# Altium footprint library CUSTOM PCB.PcbLib: 404 footprints (part 25 of 26)
Each footprint in its own frame and in the unit in brackets; x right, y up, seen from the top. Pads: shape width x height; smd on the part's side, far side on the other; paste and mask are expansions set on the pad; w line width, h text height; cw(c..) or ccw(c..) is an arc to the next point about the centre after c.
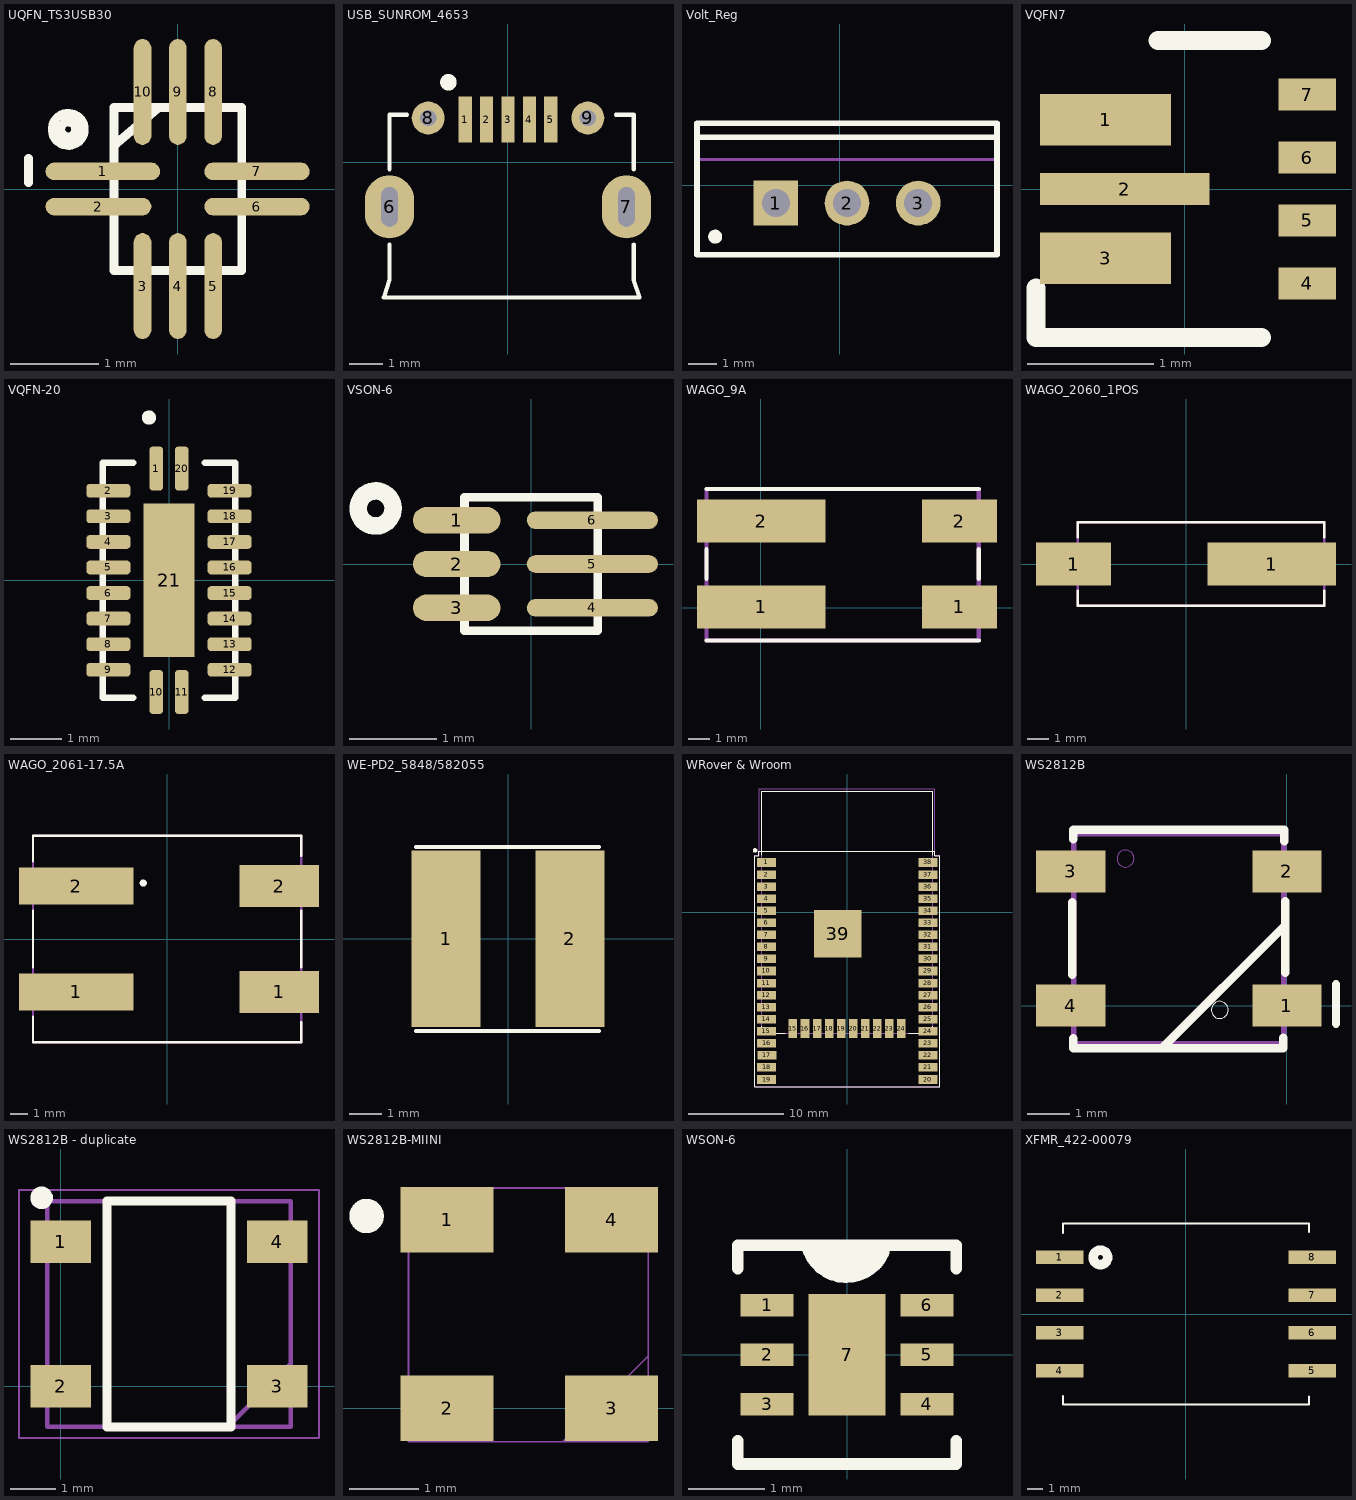
[diagram p24: the footprints below, top view; thin cyan lines are the x and y axes]

## UQFN_TS3USB30 [mm]
pads (10):
  oval 1.299x0.2 smd: 1(-0.851,0.2)
  oval 1.2x0.2 smd: 2(-0.9,-0.2)
  oval 0.2x1.2 smd: 3(-0.4,-1.1) 4(0,-1.1) 5(0.4,-1.1) 8(0.4,1.1) 9(0,1.1) 10(-0.4,1.1)
  oval 1.194x0.2 smd: 6(0.897,-0.2) 7(0.897,0.2)
Top Overlay:
  circle w0.1: c-1.242,0.676 r0.182
  circle w0.1: c-1.242,0.676 r0.085
  lines w0.1: -1.694,0.074 -1.694,0.348 ; -0.721,0.493 -0.236,0.907 ; -0.725,-0.925 0,-0.925 0.725,-0.925 0.725,0.925 -0.725,0.925 -0.725,-0.925
3D body "User Library-qfn10_rm0_4-1.step": height 0.55, standoff -0.01, extent -0.726,-0.925 0.724,0.925

## USB_SUNROM_4653 [mm]
pads (9):
  rect 0.4x1.4 smd: 1(-1.3,1.3) 2(-0.65,1.3) 3(0,1.3) 4(0.65,1.3) 5(1.3,1.3)
  oval 1.5x1.916 hole 0.5 slot 1.2 at 90 deg: 6(-3.6,-1.35) 7(3.6,-1.35)
  round 1 hole 0.5: 8(-2.425,1.35) 9(2.425,1.35)
Top Overlay:
  circle w0.4: c-1.81,2.435 r0.05
  lines w0.127: -3.597,-2.493 -3.597,-3.56 -3.775,-4.1 3.997,-4.1 3.819,-3.56 3.819,-2.493 ; -3.597,-0.207 -3.597,1.45 -3.064,1.45 ; 3.286,1.45 3.819,1.45 3.819,-0.207
Mechanical 1:
  lines w0: -3.689,-1.75 ccw(c-3.464,-1.75) -3.464,-1.975 ccw(c-3.464,-1.75) -3.239,-1.75 -3.239,-0.95 ccw(c-3.464,-0.95) -3.464,-0.725 ccw(c-3.464,-0.95) -3.689,-0.95 -3.689,-1.75 ; 3.461,-1.75 ccw(c3.686,-1.75) 3.686,-1.975 ccw(c3.686,-1.75) 3.911,-1.75 3.911,-0.95 ccw(c3.686,-0.95) 3.686,-0.725 ccw(c3.686,-0.95) 3.461,-0.95 3.461,-1.75
3D body "1050170001.stp": height 2.68, standoff -0.63, extent -4.1,-3.9 4.1,1.5

## Volt_Reg [mm] "7805 thorugh hole"
pads (3):
  rect 1.6x1.6 hole 1: 1(-2.286,-0.635)
  round 1.6 hole 1: 2(0.254,-0.635) 3(2.794,-0.635)
Top Overlay:
  circle w0.25: c-4.446,-1.835 r0.125
  lines w0.2: -5.096,1.715 5.604,1.715 ; -5.096,-2.485 -5.096,2.215 5.604,2.215 5.604,-2.485 -5.096,-2.485
Mechanical 13:
  lines w0.1: -5.096,0.915 5.604,0.915 ; -5.096,-2.485 5.604,-2.485 5.604,2.215 -5.096,2.215 -5.096,-2.485
Mechanical 15:
  lines w0.1: -0.246,-0.635 0.754,-0.635 ; 0.254,-1.135 0.254,-0.135
3D body: height 12.9, standoff 4, extent -5.146,-2.535 5.654,2.265
3D body: height 19.3, standoff 12.9, extent -5.095,0.916 5.603,2.214

## VQFN7 [mil]
pads (7):
  rect 41x16 smd paste+0 mask+0: 1(-24.68,21.65) 3(-24.68,-21.65)
  rect 53x10 smd paste+0 mask+0: 2(-18.7,0)
  rect 18x10 smd paste-5 mask+0: 4(38.39,-29.53) 5(38.39,-9.84) 6(38.39,9.84) 7(38.39,29.53)
Top Overlay:
  lines w6: -46.5,-30.94 -46.5,-46.5 24.07,-46.5 ; -8.34,46.5 24.07,46.5

## VQFN-20 [mm]
pads (21):
  rrect50% 0.27x0.86 smd: 1(-0.25,2.185) 10(-0.25,-2.185) 11(0.25,-2.185) 20(0.25,2.185)
  rrect50% 0.86x0.27 smd: 2(-1.185,1.75) 3(-1.185,1.25) 4(-1.185,0.75) 5(-1.185,0.25) 6(-1.185,-0.25) 7(-1.185,-0.75) 8(-1.185,-1.25) 9(-1.185,-1.75) 12(1.185,-1.75) 13(1.185,-1.25) 14(1.185,-0.75) 15(1.185,-0.25) 16(1.185,0.25) 17(1.185,0.75) 18(1.185,1.25) 19(1.185,1.75)
  rect 1x3 smd: 21(0,0)
Top Overlay:
  circle w0.14: c-0.392,3.181 r0.07
  lines w0.127: -0.7,-2.3 -1.3,-2.3 -1.3,2.3 -0.7,2.3 ; 0.7,-2.3 1.3,-2.3 1.3,2.3 0.7,2.3
3D body "RKS0020A.stp": height 1, standoff 0, extent -1.25,-2.25 1.25,2.25

## VSON-6 [mm]
pads (6):
  oval 1x0.3 smd paste+0 mask+0: 1(-0.85,0.5) 2(-0.85,0) 3(-0.85,-0.5)
  oval 1.5x0.2 smd paste+0 mask+0: 4(0.7,-0.5) 5(0.7,0) 6(0.7,0.5)
Top Overlay:
  circle w0.2: c-1.778,0.635 r0.2
  lines w0.1: -0.762,-0.762 0.762,-0.762 0.762,0.762 -0.762,0.762 -0.762,-0.762
3D body: height 1, standoff 0, extent -0.775,-0.775 0.775,0.775
3D body: height 0.25, standoff 0, extent 1.85,-0.6 1.85,-0.6

## WAGO_9A [mm] "AC 230V mains connector"
pads (4):
  rect 6x2 smd: 1(0.018,0.032) 2(0.018,4.032)
  rect 3.5x2 smd: 1(9.268,0.032) 2(9.268,4.032)
Top Overlay:
  lines w0.2: -2.54,-1.535 10.16,-1.535 ; -2.54,1.348 -2.54,2.716 ; -2.54,5.535 10.16,5.535 ; 10.16,1.348 10.16,2.716
Mechanical 15:
  lines w0.2: -2.54,-1.535 -2.54,5.535 10.16,5.535 10.16,-1.535 -2.54,-1.535
3D body "2060-452_998-404.stp": height 5.48, standoff -0.02, extent -2.359,-1.905 10.741,5.995

## WAGO_2060_1POS [mm]
pads (2):
  rect 3.5x2 smd: 1(-5.25,0)
  rect 6x2 smd: 1(4,0)
Top Overlay:
  lines w0.127: -5.05,-1.25 -5.05,-1.95 6.45,-1.95 6.45,-1.25 ; -5.05,1.25 -5.05,1.95 6.45,1.95 6.45,1.25
Mechanical 4:
  lines w0.127: -5.05,-1.95 -5.05,1.95 ; -5.05,-1.95 6.45,-1.95 ; -5.05,-1.95 -5.05,1.95 ; -5.05,-1.95 6.45,-1.95 ; -5.05,1.95 6.45,1.95 ; -5.05,1.95 6.45,1.95 ; 6.45,-1.95 6.45,1.95 ; 6.45,-1.95 6.45,1.95
3D body "2060-451_998-404.stp": height 5.4, standoff -0.1, extent -6.665,-1.896 6.435,2.004

## WAGO_2061-17.5A [mm]
pads (4):
  rect 6.5x2.1 smd: 1(-5.15,-3) 2(-5.15,3)
  rect 4.5x2.4 smd: 1(6.35,-3) 2(6.35,3)
Top Overlay:
  circle w0.2: c-1.358,3.169 r0.1
  lines w0.127: -7.6,-4.4 -7.6,-5.85 7.6,-5.85 7.6,-4.7 ; -7.6,-1.6 -7.6,1.6 ; -7.6,4.4 -7.6,5.85 7.6,5.85 7.6,4.7 ; 7.6,-1.6 7.6,1.6
Mechanical 4:
  lines w0.127: -7.6,-5.85 -7.6,5.85 ; -7.6,-5.85 7.6,-5.85 ; -7.6,-5.85 -7.6,5.85 ; -7.6,-5.85 7.6,-5.85 ; -7.6,5.85 7.6,5.85 ; -7.6,5.85 7.6,5.85 ; 7.6,-5.85 7.6,5.85 ; 7.6,-5.85 7.6,5.85
3D body "2061-602_998-404.stp": height 6.6, standoff -0.15, extent -7.672,-5.865 8.128,5.835

## WE-PD2_5848/582055 [mm]
pads (2):
  rect 2.15x5.5 smd: 1(-1.925,0) 2(1.925,0)
Top Overlay:
  lines w0.127: -2.868,-2.868 2.841,-2.868 ; -2.868,2.855 2.841,2.855
3D body "STEP-WE-PD2-5848-rev1.stp": height 4.5, standoff 0, extent -2.894,-2.6 2.894,2.6

## WRover & Wroom [mm]
pads (49):
  rect 2x0.9 smd: 1(-8.5,5.26) 2(-8.5,3.99) 3(-8.5,2.72) 4(-8.5,1.45) 5(-8.5,0.18) 6(-8.5,-1.09) 7(-8.5,-2.36) 8(-8.5,-3.63) 9(-8.5,-4.9) 10(-8.5,-6.17) 11(-8.5,-7.44) 12(-8.5,-8.71) 13(-8.5,-9.98) 14(-8.5,-11.25) 15(-8.5,-12.52) 16(-8.484,-13.79) 17(-8.458,-15.06) 18(-8.484,-16.33) 19(-8.484,-17.6) 20(8.5,-17.6) 21(8.5,-16.33) 22(8.5,-15.06) 23(8.5,-13.76) 24(8.5,-12.52) 25(8.5,-11.25) 26(8.5,-9.98) 27(8.5,-8.71) 28(8.5,-7.44) 29(8.5,-6.17) 30(8.5,-4.9) 31(8.5,-3.63) 32(8.5,-2.36) 33(8.5,-1.09) 34(8.5,0.18) 35(8.5,1.45) 36(8.5,2.72) 37(8.5,3.99) 38(8.5,5.26)
  rect 0.9x2 smd: 15(-5.715,-12.25) 16(-4.445,-12.25) 17(-3.175,-12.25) 18(-1.905,-12.25) 19(-0.635,-12.25) 20(0.635,-12.25) 21(1.905,-12.25) 22(3.175,-12.25) 23(4.445,-12.25) 24(5.715,-12.25)
  rect 5x5 smd: 39(-1,-2.24)
Top Overlay:
  lines w0.05: -8.96,6.45 -9.296,6.45 -9.296,5.994 -9.754,5.994 -9.754,-18.339 -9.728,-18.339 9.754,-18.339 9.754,5.994 9.246,5.994 9.246,6.45 8.96,6.45
  lines w0.127: -9,-12 -9,-12.75 -6.5,-12.75 ; -9,6 -9,12.75 9,12.75 9,6 ; -8.96,6.45 8.96,6.45 ; 6.5,-12.75 9,-12.75 9,-12
  lines w0.3: -9.649,6.634 ccw(c-9.691,6.543) -9.591,6.543
Top Paste:
  region: -2.584,-0.659 0.581,-0.659 0.581,-3.825 -2.584,-3.825
Mechanical 4:
  circle w0.3: c-8.277,5.238 r0.1
  circle w0.3: c-8.277,5.238 r0.1
  lines w0.127: -9,-12.75 -9,12.75 ; -9,-12.75 9,-12.75 ; -9,-12.75 -9,12.75 ; -9,-12.75 9,-12.75 ; -9,12.75 9,12.75 ; -9,12.75 9,12.75 ; 9,-12.75 9,12.75 ; 9,-12.75 9,12.75 ; -8.96,6.45 8.96,6.45 -8.96,6.45
  text "ANTENNA" at -5.725,8.401 h1.88
  text "ANTENNA" at -5.725,8.401 h1.88
Mechanical 16:
  lines w0.05: -9.699,-18.351 9.75,-18.351 ; -9.699,-18.351 -9.75,-18.301 -9.75,-13.5 -9.75,6 -9.25,6 -9.25,13 9.25,13 9.25,6 9.75,6 9.75,-13.5 9.75,-18.351 ; -9.699,-18.351 -4.824,-18.351 4.926,-18.351 9.75,-18.351
3D body "ESP32-WROOM-32D--3DModel-STEP-56544.STEP": height 3.25, standoff 0, extent -8.949,-12.75 9.051,12.75

## WS2812B [mm]
pads (4):
  rect 1.651x1 smd: 1(0,0) 2(0,3.2) 3(-5.154,3.2) 4(-5.154,0)
Top Overlay:
  circle w0: c-1.6,-0.102 r0.203
  lines w0.2: -2.972,-1.011 -0.037,1.924 ; 1.168,-0.432 1.168,0.508
  lines w0.203: -5.117,0.736 -5.117,1.6 -5.117,2.464 ; -5.089,-0.78 -5.089,-1.011 -0.139,-1.011 -0.139,-1.016 -0.088,-1.016 -0.088,-0.762 ; -5.087,3.967 -5.087,4.193 -0.118,4.193 -0.118,4.191 -0.067,4.191 -0.067,3.919 ; -0.037,0.787 -0.037,2.489
Mechanical 4:
  circle w0: c-3.847,3.505 r0.203
  circle w0: c-3.847,3.505 r0.203
  lines w0.127: -5.077,-0.9 -0.077,-0.9 ; -5.077,-0.9 -5.077,4.1 ; -5.077,-0.9 -0.077,-0.9 ; -5.077,-0.9 -5.077,4.1 ; -5.077,4.1 -0.077,4.1 ; -5.077,4.1 -0.077,4.1 ; -0.077,-0.9 -0.077,4.1 ; -0.077,-0.9 -0.077,4.1
3D body "User Library-ws2812B-1.step": height -0.63, standoff -2.2, extent -5.214,-0.874 0.186,4.126

## WS2812B - duplicate [mm] "RGB LED"
pads (4):
  rect 1.35x0.95 smd: 1(0,3.2) 2(0,0) 3(4.8,0) 4(4.8,3.2)
Top Overlay:
  circle w0.25: c-0.425,4.175 r0.125
  lines w0.2: 1.025,-0.9 1.025,4.1 3.775,4.1 3.775,-0.9 1.025,-0.9
Mechanical 15:
  lines w0.1: 3.725,-0.875 5.075,0.475 ; -0.3,-0.9 -0.3,4.1 5.1,4.1 5.1,-0.9 -0.3,-0.9
Mechanical 20:
  lines w0.05: -0.925,-1.15 -0.925,4.35 5.725,4.35 5.725,-1.15 -0.925,-1.15

## WS2812B-MIINI [mm]
pads (4):
  rect 1.35x0.95 smd: 1(2.413,2.743) 2(2.413,0) 3(4.8,0) 4(4.8,2.743)
Top Overlay:
  circle w0.25: c1.245,2.794 r0.125
Mechanical 4:
  lines w0.025: 4.089,-0.483 5.334,0.762 ; 1.854,-0.483 1.854,3.2 5.334,3.2 5.334,-0.483 1.854,-0.483
3D body: height 0.25, standoff 0, extent 1.727,3.226 1.727,3.226
3D body: height 0.25, standoff 0, extent 1.727,3.226 1.727,3.226
3D body: height 0.25, standoff 0, extent 5.486,-0.483 5.486,-0.483
3D body: height 1.95, standoff 0, extent 1.854,-0.483 5.334,3.2

## WSON-6 [mm]
pads (7):
  rect 0.7x0.3 smd: 1(-1.05,0.65) 2(-1.05,0) 3(-1.05,-0.65) 4(1.05,-0.65) 5(1.05,0) 6(1.05,0.65)
  rect 1.016x1.6 smd: 7(0,0)
Top Overlay:
  lines w0.152: -1.435,-1.131 -1.435,-1.435 1.435,-1.435 1.435,-1.131 ; -1.435,1.131 -1.435,1.435 1.435,1.435 1.435,1.131
  lines w0.2: -0.483,1.372 ccw(c-0.008,1.546) 0.457,1.346
  lines w0.25: -0.323,1.344 ccw(c0.019,1.873) 0.422,1.389
3D body "DRV6_1P6X1.step": height 0.81, standoff 0, extent -1.054,-1.054 1.054,1.054

## XFMR_422-00079 [mm]
pads (8):
  rect 3.13x0.9 smd: 1(-8.37,3.75) 2(-8.37,1.25) 3(-8.37,-1.25) 4(-8.37,-3.75) 5(8.37,-3.75) 6(8.37,-1.25) 7(8.37,1.25) 8(8.37,3.75)
Top Overlay:
  circle w0.635: c-5.671,3.749 r0.481
  lines w0.15: -8.15,-5.45 -8.15,-6 8.15,-6 8.15,-5.46 ; -8.15,5.37 -8.15,6 8.15,6 8.15,5.44
Mechanical 15:
  text "2" at -8.549,1 h0.64
  text "3" at -8.549,-1.5 h0.64
  text "6" at 8.191,-1.5 h0.64
  text "8" at 8.191,3.5 h0.64
  text "1" at -8.549,3.5 h0.64
  text "7" at 8.191,1 h0.64
  text "5" at 8.191,-4 h0.64
  text "4" at -8.549,-4 h0.64